# Altium schematic symbol library jlcpcb_2025_04_resistors_extended_1210.schlib: 2670 symbols (part 10 of 14)
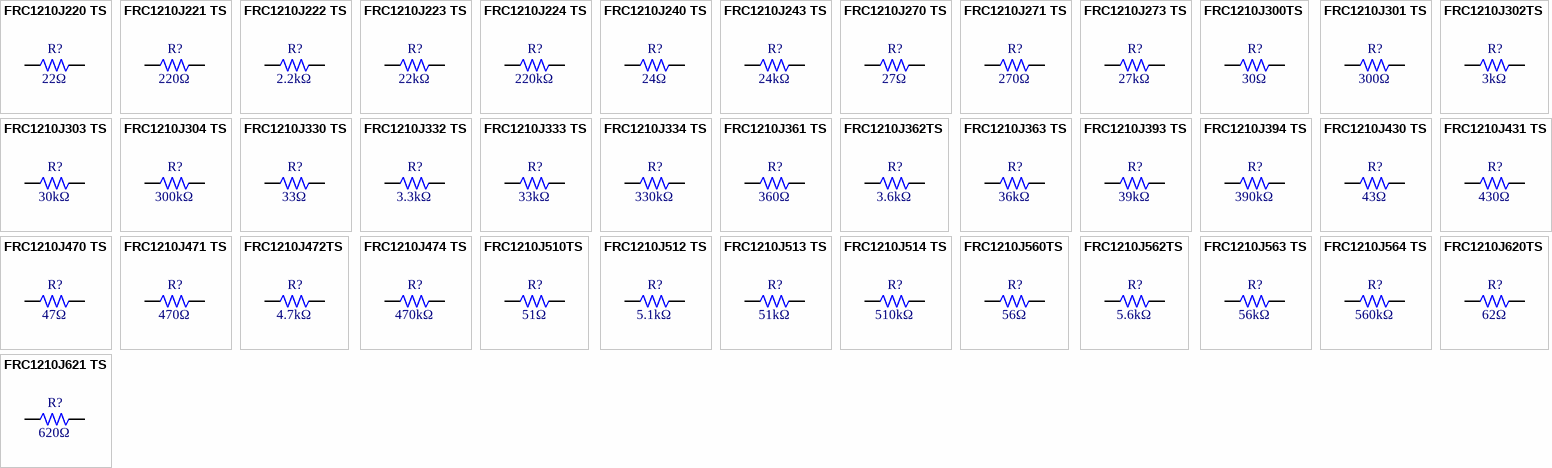
[diagram p75: symbols FRC1210J220 TS to FRC1210J621 TS]

## FRC1210J512 TS
designator R?  Resistance: 5.1kΩ  (hidden comment: *)
Resistor, 5.1kΩ, ±5%, 333.333mW, 200V, ±100ppm/℃, -55℃~+155℃, SMD 1210; Manufacturer: Uniroyal; Manufacturer Part Number: FRC1210J512 TS; Supplier 1: LCSC; Supplier Part Number 1: C2933867; JLCPCB Part Number: C2933867; Power Rating: 333.333mW; Category: Resistors; Package Size: 1210; JLCPCB Basic Part: Yes; Tolerance: ±5%; Voltage Rating: 200V; Temperature Coefficient: ±100ppm/℃; Temperature Rating: -55℃~+155℃; ComponentLink1Description: Datasheet; ComponentLink1URL: https://wmsc.lcsc.com/wmsc/upload/file/pdf/v2/lcsc/2308241115_FOJAN-FRC1210J512-TS_C2933867.pdf; ComponentLink2Description: JLCPCB Part URL; ComponentLink2URL: https://jlcpcb.com/partdetail/C2933867
pins: 1, 2
1 alternate drawing of the same symbol

## FRC1210J513 TS
designator R?  Resistance: 51kΩ  (hidden comment: *)
Resistor, 51kΩ, ±5%, 333.333mW, 200V, ±100ppm/℃, -55℃~+155℃, SMD 1210; Manufacturer: Uniroyal; Manufacturer Part Number: FRC1210J513 TS; Supplier 1: LCSC; Supplier Part Number 1: C2960679; JLCPCB Part Number: C2960679; Power Rating: 333.333mW; Category: Resistors; Package Size: 1210; JLCPCB Basic Part: Yes; Tolerance: ±5%; Voltage Rating: 200V; Temperature Coefficient: ±100ppm/℃; Temperature Rating: -55℃~+155℃; ComponentLink1Description: Datasheet; ComponentLink1URL: https://wmsc.lcsc.com/wmsc/upload/file/pdf/v2/lcsc/2308241947_FOJAN-FRC1210J513-TS_C2960679.pdf; ComponentLink2Description: JLCPCB Part URL; ComponentLink2URL: https://jlcpcb.com/partdetail/C2960679
pins: 1, 2
1 alternate drawing of the same symbol

## FRC1210J514 TS
designator R?  Resistance: 510kΩ  (hidden comment: *)
Resistor, 510kΩ, ±5%, 333.333mW, 200V, ±100ppm/℃, -55℃~+155℃, SMD 1210; Manufacturer: Uniroyal; Manufacturer Part Number: FRC1210J514 TS; Supplier 1: LCSC; Supplier Part Number 1: C2960696; JLCPCB Part Number: C2960696; Power Rating: 333.333mW; Category: Resistors; Package Size: 1210; JLCPCB Basic Part: Yes; Tolerance: ±5%; Voltage Rating: 200V; Temperature Coefficient: ±100ppm/℃; Temperature Rating: -55℃~+155℃; ComponentLink1Description: Datasheet; ComponentLink1URL: https://wmsc.lcsc.com/wmsc/upload/file/pdf/v2/lcsc/2308241947_FOJAN-FRC1210J514-TS_C2960696.pdf; ComponentLink2Description: JLCPCB Part URL; ComponentLink2URL: https://jlcpcb.com/partdetail/C2960696
pins: 1, 2
1 alternate drawing of the same symbol

## FRC1210J560TS
designator R?  Resistance: 56Ω  (hidden comment: *)
Resistor, 56Ω, ±5%, 333.333mW, 200V, ±100ppm/℃, -55℃~+155℃, SMD 1210; Manufacturer: Uniroyal; Manufacturer Part Number: FRC1210J560TS; Supplier 1: LCSC; Supplier Part Number 1: C2930446; JLCPCB Part Number: C2930446; Power Rating: 333.333mW; Category: Resistors; Package Size: 1210; JLCPCB Basic Part: Yes; Tolerance: ±5%; Voltage Rating: 200V; Temperature Coefficient: ±100ppm/℃; Temperature Rating: -55℃~+155℃; ComponentLink1Description: Datasheet; ComponentLink1URL: https://wmsc.lcsc.com/wmsc/upload/file/pdf/v2/lcsc/2308241947_FOJAN-FRC1210J560TS_C2930446.pdf; ComponentLink2Description: JLCPCB Part URL; ComponentLink2URL: https://jlcpcb.com/partdetail/C2930446
pins: 1, 2
1 alternate drawing of the same symbol

## FRC1210J562TS
designator R?  Resistance: 5.6kΩ  (hidden comment: *)
Resistor, 5.6kΩ, ±5%, 333.333mW, 200V, ±100ppm/℃, -55℃~+155℃, SMD 1210; Manufacturer: Uniroyal; Manufacturer Part Number: FRC1210J562TS; Supplier 1: LCSC; Supplier Part Number 1: C2930445; JLCPCB Part Number: C2930445; Power Rating: 333.333mW; Category: Resistors; Package Size: 1210; JLCPCB Basic Part: Yes; Tolerance: ±5%; Voltage Rating: 200V; Temperature Coefficient: ±100ppm/℃; Temperature Rating: -55℃~+155℃; ComponentLink1Description: Datasheet; ComponentLink1URL: https://wmsc.lcsc.com/wmsc/upload/file/pdf/v2/lcsc/2308241947_FOJAN-FRC1210J562TS_C2930445.pdf; ComponentLink2Description: JLCPCB Part URL; ComponentLink2URL: https://jlcpcb.com/partdetail/C2930445
pins: 1, 2
1 alternate drawing of the same symbol

## FRC1210J563 TS
designator R?  Resistance: 56kΩ  (hidden comment: *)
Resistor, 56kΩ, ±5%, 333.333mW, 200V, ±100ppm/℃, -55℃~+155℃, SMD 1210; Manufacturer: Uniroyal; Manufacturer Part Number: FRC1210J563 TS; Supplier 1: LCSC; Supplier Part Number 1: C2960918; JLCPCB Part Number: C2960918; Power Rating: 333.333mW; Category: Resistors; Package Size: 1210; JLCPCB Basic Part: Yes; Tolerance: ±5%; Voltage Rating: 200V; Temperature Coefficient: ±100ppm/℃; Temperature Rating: -55℃~+155℃; ComponentLink1Description: Datasheet; ComponentLink1URL: https://wmsc.lcsc.com/wmsc/upload/file/pdf/v2/lcsc/2308241947_FOJAN-FRC1210J563-TS_C2960918.pdf; ComponentLink2Description: JLCPCB Part URL; ComponentLink2URL: https://jlcpcb.com/partdetail/C2960918
pins: 1, 2
1 alternate drawing of the same symbol

## FRC1210J564 TS
designator R?  Resistance: 560kΩ  (hidden comment: *)
Resistor, 560kΩ, ±5%, 333.333mW, 200V, ±100ppm/℃, -55℃~+155℃, SMD 1210; Manufacturer: Uniroyal; Manufacturer Part Number: FRC1210J564 TS; Supplier 1: LCSC; Supplier Part Number 1: C2933869; JLCPCB Part Number: C2933869; Power Rating: 333.333mW; Category: Resistors; Package Size: 1210; JLCPCB Basic Part: Yes; Tolerance: ±5%; Voltage Rating: 200V; Temperature Coefficient: ±100ppm/℃; Temperature Rating: -55℃~+155℃; ComponentLink1Description: Datasheet; ComponentLink1URL: https://wmsc.lcsc.com/wmsc/upload/file/pdf/v2/lcsc/2308241115_FOJAN-FRC1210J564-TS_C2933869.pdf; ComponentLink2Description: JLCPCB Part URL; ComponentLink2URL: https://jlcpcb.com/partdetail/C2933869
pins: 1, 2
1 alternate drawing of the same symbol

## FRC1210J620TS
designator R?  Resistance: 62Ω  (hidden comment: *)
Resistor, 62Ω, ±5%, 333.333mW, 200V, ±100ppm/℃, SMD 1210; Manufacturer: Uniroyal; Manufacturer Part Number: FRC1210J620TS; Supplier 1: LCSC; Supplier Part Number 1: C3000565; JLCPCB Part Number: C3000565; Power Rating: 333.333mW; Category: Resistors; Package Size: 1210; JLCPCB Basic Part: Yes; Tolerance: ±5%; Voltage Rating: 200V; Temperature Coefficient: ±100ppm/℃; ComponentLink1Description: Datasheet; ComponentLink1URL: https://wmsc.lcsc.com/wmsc/upload/file/pdf/v2/lcsc/2308241947_FOJAN-FRC1210J620TS_C3000565.pdf; ComponentLink2Description: JLCPCB Part URL; ComponentLink2URL: https://jlcpcb.com/partdetail/C3000565
pins: 1, 2
1 alternate drawing of the same symbol

## FRC1210J621 TS
designator R?  Resistance: 620Ω  (hidden comment: *)
Resistor, 620Ω, ±5%, 333.333mW, 200V, ±100ppm/℃, -55℃~+155℃, SMD 1210; Manufacturer: Uniroyal; Manufacturer Part Number: FRC1210J621 TS; Supplier 1: LCSC; Supplier Part Number 1: C2933871; JLCPCB Part Number: C2933871; Power Rating: 333.333mW; Category: Resistors; Package Size: 1210; JLCPCB Basic Part: Yes; Tolerance: ±5%; Voltage Rating: 200V; Temperature Coefficient: ±100ppm/℃; Temperature Rating: -55℃~+155℃; ComponentLink1Description: Datasheet; ComponentLink1URL: https://wmsc.lcsc.com/wmsc/upload/file/pdf/v2/lcsc/2308241115_FOJAN-FRC1210J621-TS_C2933871.pdf; ComponentLink2Description: JLCPCB Part URL; ComponentLink2URL: https://jlcpcb.com/partdetail/C2933871
pins: 1, 2
1 alternate drawing of the same symbol

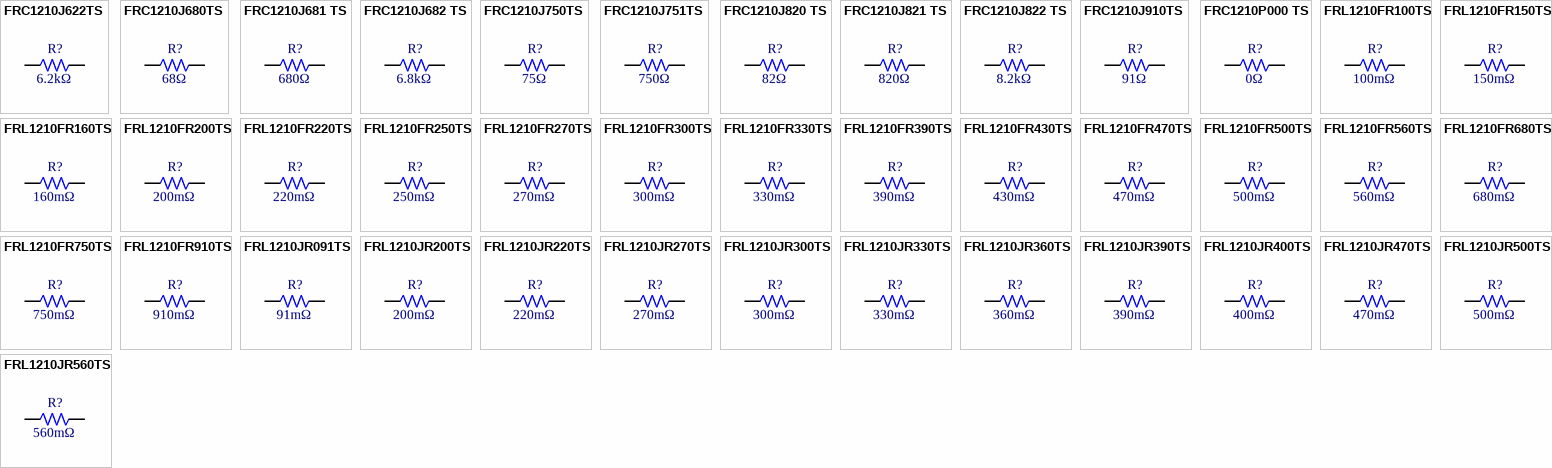
[diagram p44: symbols FRC1210J622TS to FRL1210JR560TS]

## FRC1210J622TS
designator R?  Resistance: 6.2kΩ  (hidden comment: *)
Resistor, 6.2kΩ, ±5%, 333.333mW, 200V, ±100ppm/℃, -55℃~+155℃, SMD 1210; Manufacturer: Uniroyal; Manufacturer Part Number: FRC1210J622TS; Supplier 1: LCSC; Supplier Part Number 1: C2930447; JLCPCB Part Number: C2930447; Power Rating: 333.333mW; Category: Resistors; Package Size: 1210; JLCPCB Basic Part: Yes; Tolerance: ±5%; Voltage Rating: 200V; Temperature Coefficient: ±100ppm/℃; Temperature Rating: -55℃~+155℃; ComponentLink1Description: Datasheet; ComponentLink1URL: https://wmsc.lcsc.com/wmsc/upload/file/pdf/v2/lcsc/2308241947_FOJAN-FRC1210J622TS_C2930447.pdf; ComponentLink2Description: JLCPCB Part URL; ComponentLink2URL: https://jlcpcb.com/partdetail/C2930447
pins: 1, 2
1 alternate drawing of the same symbol

## FRC1210J680TS
designator R?  Resistance: 68Ω  (hidden comment: *)
Resistor, 68Ω, ±5%, 333.333mW, 200V, ±100ppm/℃, -55℃~+155℃, SMD 1210; Manufacturer: Uniroyal; Manufacturer Part Number: FRC1210J680TS; Supplier 1: LCSC; Supplier Part Number 1: C2930448; JLCPCB Part Number: C2930448; Power Rating: 333.333mW; Category: Resistors; Package Size: 1210; JLCPCB Basic Part: Yes; Tolerance: ±5%; Voltage Rating: 200V; Temperature Coefficient: ±100ppm/℃; Temperature Rating: -55℃~+155℃; ComponentLink1Description: Datasheet; ComponentLink1URL: https://wmsc.lcsc.com/wmsc/upload/file/pdf/v2/lcsc/2308241947_FOJAN-FRC1210J680TS_C2930448.pdf; ComponentLink2Description: JLCPCB Part URL; ComponentLink2URL: https://jlcpcb.com/partdetail/C2930448
pins: 1, 2
1 alternate drawing of the same symbol

## FRC1210J681 TS
designator R?  Resistance: 680Ω  (hidden comment: *)
Resistor, 680Ω, ±5%, 333.333mW, 200V, ±100ppm/℃, -55℃~+155℃, SMD 1210; Manufacturer: Uniroyal; Manufacturer Part Number: FRC1210J681 TS; Supplier 1: LCSC; Supplier Part Number 1: C2907553; JLCPCB Part Number: C2907553; Power Rating: 333.333mW; Category: Resistors; Package Size: 1210; JLCPCB Basic Part: Yes; Tolerance: ±5%; Voltage Rating: 200V; Temperature Coefficient: ±100ppm/℃; Temperature Rating: -55℃~+155℃; ComponentLink1Description: Datasheet; ComponentLink1URL: https://wmsc.lcsc.com/wmsc/upload/file/pdf/v2/lcsc/2308241947_FOJAN-FRC1210J681-TS_C2907553.pdf; ComponentLink2Description: JLCPCB Part URL; ComponentLink2URL: https://jlcpcb.com/partdetail/C2907553
pins: 1, 2
1 alternate drawing of the same symbol

## FRC1210J682 TS
designator R?  Resistance: 6.8kΩ  (hidden comment: *)
Resistor, 6.8kΩ, ±5%, 333.333mW, 200V, ±100ppm/℃, -55℃~+155℃, SMD 1210; Manufacturer: Uniroyal; Manufacturer Part Number: FRC1210J682 TS; Supplier 1: LCSC; Supplier Part Number 1: C2933872; JLCPCB Part Number: C2933872; Power Rating: 333.333mW; Category: Resistors; Package Size: 1210; JLCPCB Basic Part: Yes; Tolerance: ±5%; Voltage Rating: 200V; Temperature Coefficient: ±100ppm/℃; Temperature Rating: -55℃~+155℃; ComponentLink1Description: Datasheet; ComponentLink1URL: https://wmsc.lcsc.com/wmsc/upload/file/pdf/v2/lcsc/2308241115_FOJAN-FRC1210J682-TS_C2933872.pdf; ComponentLink2Description: JLCPCB Part URL; ComponentLink2URL: https://jlcpcb.com/partdetail/C2933872
pins: 1, 2
1 alternate drawing of the same symbol

## FRC1210J750TS
designator R?  Resistance: 75Ω  (hidden comment: *)
Resistor, 75Ω, ±5%, 333.333mW, 200V, ±100ppm/℃, SMD 1210; Manufacturer: Uniroyal; Manufacturer Part Number: FRC1210J750TS; Supplier 1: LCSC; Supplier Part Number 1: C3000695; JLCPCB Part Number: C3000695; Power Rating: 333.333mW; Category: Resistors; Package Size: 1210; JLCPCB Basic Part: Yes; Tolerance: ±5%; Voltage Rating: 200V; Temperature Coefficient: ±100ppm/℃; ComponentLink1Description: Datasheet; ComponentLink1URL: https://wmsc.lcsc.com/wmsc/upload/file/pdf/v2/lcsc/2308241947_FOJAN-FRC1210J750TS_C3000695.pdf; ComponentLink2Description: JLCPCB Part URL; ComponentLink2URL: https://jlcpcb.com/partdetail/C3000695
pins: 1, 2
1 alternate drawing of the same symbol

## FRC1210J751TS
designator R?  Resistance: 750Ω  (hidden comment: *)
Resistor, 750Ω, ±5%, 333.333mW, 200V, ±100ppm/℃, SMD 1210; Manufacturer: Uniroyal; Manufacturer Part Number: FRC1210J751TS; Supplier 1: LCSC; Supplier Part Number 1: C3000694; JLCPCB Part Number: C3000694; Power Rating: 333.333mW; Category: Resistors; Package Size: 1210; JLCPCB Basic Part: Yes; Tolerance: ±5%; Voltage Rating: 200V; Temperature Coefficient: ±100ppm/℃; ComponentLink1Description: Datasheet; ComponentLink1URL: https://wmsc.lcsc.com/wmsc/upload/file/pdf/v2/lcsc/2308241947_FOJAN-FRC1210J751TS_C3000694.pdf; ComponentLink2Description: JLCPCB Part URL; ComponentLink2URL: https://jlcpcb.com/partdetail/C3000694
pins: 1, 2
1 alternate drawing of the same symbol

## FRC1210J820 TS
designator R?  Resistance: 82Ω  (hidden comment: *)
Resistor, 82Ω, ±5%, 333.333mW, 200V, ±100ppm/℃, -55℃~+155℃, SMD 1210; Manufacturer: Uniroyal; Manufacturer Part Number: FRC1210J820 TS; Supplier 1: LCSC; Supplier Part Number 1: C2960766; JLCPCB Part Number: C2960766; Power Rating: 333.333mW; Category: Resistors; Package Size: 1210; JLCPCB Basic Part: Yes; Tolerance: ±5%; Voltage Rating: 200V; Temperature Coefficient: ±100ppm/℃; Temperature Rating: -55℃~+155℃; ComponentLink1Description: Datasheet; ComponentLink1URL: https://wmsc.lcsc.com/wmsc/upload/file/pdf/v2/lcsc/2308241947_FOJAN-FRC1210J820-TS_C2960766.pdf; ComponentLink2Description: JLCPCB Part URL; ComponentLink2URL: https://jlcpcb.com/partdetail/C2960766
pins: 1, 2
1 alternate drawing of the same symbol

## FRC1210J821 TS
designator R?  Resistance: 820Ω  (hidden comment: *)
Resistor, 820Ω, ±5%, 333.333mW, 200V, ±100ppm/℃, -55℃~+155℃, SMD 1210; Manufacturer: Uniroyal; Manufacturer Part Number: FRC1210J821 TS; Supplier 1: LCSC; Supplier Part Number 1: C2907554; JLCPCB Part Number: C2907554; Power Rating: 333.333mW; Category: Resistors; Package Size: 1210; JLCPCB Basic Part: Yes; Tolerance: ±5%; Voltage Rating: 200V; Temperature Coefficient: ±100ppm/℃; Temperature Rating: -55℃~+155℃; ComponentLink1Description: Datasheet; ComponentLink1URL: https://wmsc.lcsc.com/wmsc/upload/file/pdf/v2/lcsc/2308241947_FOJAN-FRC1210J821-TS_C2907554.pdf; ComponentLink2Description: JLCPCB Part URL; ComponentLink2URL: https://jlcpcb.com/partdetail/C2907554
pins: 1, 2
1 alternate drawing of the same symbol

## FRC1210J822 TS
designator R?  Resistance: 8.2kΩ  (hidden comment: *)
Resistor, 8.2kΩ, ±5%, 333.333mW, 200V, ±100ppm/℃, -55℃~+155℃, SMD 1210; Manufacturer: Uniroyal; Manufacturer Part Number: FRC1210J822 TS; Supplier 1: LCSC; Supplier Part Number 1: C2960785; JLCPCB Part Number: C2960785; Power Rating: 333.333mW; Category: Resistors; Package Size: 1210; JLCPCB Basic Part: Yes; Tolerance: ±5%; Voltage Rating: 200V; Temperature Coefficient: ±100ppm/℃; Temperature Rating: -55℃~+155℃; ComponentLink1Description: Datasheet; ComponentLink1URL: https://wmsc.lcsc.com/wmsc/upload/file/pdf/v2/lcsc/2308241947_FOJAN-FRC1210J822-TS_C2960785.pdf; ComponentLink2Description: JLCPCB Part URL; ComponentLink2URL: https://jlcpcb.com/partdetail/C2960785
pins: 1, 2
1 alternate drawing of the same symbol

## FRC1210J910TS
designator R?  Resistance: 91Ω  (hidden comment: *)
Resistor, 91Ω, ±5%, 333.333mW, 200V, ±100ppm/℃, SMD 1210; Manufacturer: Uniroyal; Manufacturer Part Number: FRC1210J910TS; Supplier 1: LCSC; Supplier Part Number 1: C3000567; JLCPCB Part Number: C3000567; Power Rating: 333.333mW; Category: Resistors; Package Size: 1210; JLCPCB Basic Part: Yes; Tolerance: ±5%; Voltage Rating: 200V; Temperature Coefficient: ±100ppm/℃; ComponentLink1Description: Datasheet; ComponentLink1URL: https://wmsc.lcsc.com/wmsc/upload/file/pdf/v2/lcsc/2308241947_FOJAN-FRC1210J910TS_C3000567.pdf; ComponentLink2Description: JLCPCB Part URL; ComponentLink2URL: https://jlcpcb.com/partdetail/C3000567
pins: 1, 2
1 alternate drawing of the same symbol

## FRC1210P000 TS
designator R?  Resistance: 0Ω  (hidden comment: *)
Resistor, 0Ω, -55℃~+155℃, SMD 1210; Manufacturer: Uniroyal; Manufacturer Part Number: FRC1210P000 TS; Supplier 1: LCSC; Supplier Part Number 1: C2907543; JLCPCB Part Number: C2907543; Category: Resistors; Package Size: 1210; JLCPCB Basic Part: Yes; Temperature Rating: -55℃~+155℃; ComponentLink1Description: Datasheet; ComponentLink1URL: https://wmsc.lcsc.com/wmsc/upload/file/pdf/v2/lcsc/2308241947_FOJAN-FRC1210P000-TS_C2907543.pdf; ComponentLink2Description: JLCPCB Part URL; ComponentLink2URL: https://jlcpcb.com/partdetail/C2907543
pins: 1, 2
1 alternate drawing of the same symbol

## FRL1210FR100TS
designator R?  Resistance: 100mΩ  (hidden comment: *)
Resistor, 100mΩ, ±1%, 333.333mW, 500V, ±1200ppm/℃, -55℃~+155℃, SMD 1210; Manufacturer: Uniroyal; Manufacturer Part Number: FRL1210FR100TS; Supplier 1: LCSC; Supplier Part Number 1: C2974119; JLCPCB Part Number: C2974119; Power Rating: 333.333mW; Category: Resistors; Package Size: 1210; JLCPCB Basic Part: Yes; Tolerance: ±1%; Voltage Rating: 500V; Temperature Coefficient: ±1200ppm/℃; Temperature Rating: -55℃~+155℃; ComponentLink1Description: Datasheet; ComponentLink1URL: https://wmsc.lcsc.com/wmsc/upload/file/pdf/v2/lcsc/2202151130_FOJAN-FRL1210FR100TS_C2974119.pdf; ComponentLink2Description: JLCPCB Part URL; ComponentLink2URL: https://jlcpcb.com/partdetail/C2974119
pins: 1, 2
1 alternate drawing of the same symbol

## FRL1210FR150TS
designator R?  Resistance: 150mΩ  (hidden comment: *)
Resistor, 150mΩ, ±1%, 333.333mW, 500V, ±1200ppm/℃, -55℃~+155℃, SMD 1210; Manufacturer: Uniroyal; Manufacturer Part Number: FRL1210FR150TS; Supplier 1: LCSC; Supplier Part Number 1: C2934310; JLCPCB Part Number: C2934310; Power Rating: 333.333mW; Category: Resistors; Package Size: 1210; JLCPCB Basic Part: Yes; Tolerance: ±1%; Voltage Rating: 500V; Temperature Coefficient: ±1200ppm/℃; Temperature Rating: -55℃~+155℃; ComponentLink1Description: Datasheet; ComponentLink1URL: https://wmsc.lcsc.com/wmsc/upload/file/pdf/v2/lcsc/2308241947_FOJAN-FRL1210FR150TS_C2934310.pdf; ComponentLink2Description: JLCPCB Part URL; ComponentLink2URL: https://jlcpcb.com/partdetail/C2934310
pins: 1, 2
1 alternate drawing of the same symbol

## FRL1210FR160TS
designator R?  Resistance: 160mΩ  (hidden comment: *)
Resistor, 160mΩ, ±1%, 500mW, 200V, ±200ppm/℃, -55℃~+155℃, SMD 1210; Manufacturer: Uniroyal; Manufacturer Part Number: FRL1210FR160TS; Supplier 1: LCSC; Supplier Part Number 1: C2934311; JLCPCB Part Number: C2934311; Power Rating: 500mW; Category: Resistors; Package Size: 1210; JLCPCB Basic Part: Yes; Tolerance: ±1%; Voltage Rating: 200V; Temperature Coefficient: ±200ppm/℃; Temperature Rating: -55℃~+155℃; ComponentLink1Description: Datasheet; ComponentLink1URL: https://wmsc.lcsc.com/wmsc/upload/file/pdf/v2/lcsc/2308241947_FOJAN-FRL1210FR160TS_C2934311.pdf; ComponentLink2Description: JLCPCB Part URL; ComponentLink2URL: https://jlcpcb.com/partdetail/C2934311
pins: 1, 2
1 alternate drawing of the same symbol

## FRL1210FR200TS
designator R?  Resistance: 200mΩ  (hidden comment: *)
Resistor, 200mΩ, ±1%, 333.333mW, 500V, ±600ppm/℃, -55℃~+155℃, SMD 1210; Manufacturer: Uniroyal; Manufacturer Part Number: FRL1210FR200TS; Supplier 1: LCSC; Supplier Part Number 1: C2934312; JLCPCB Part Number: C2934312; Power Rating: 333.333mW; Category: Resistors; Package Size: 1210; JLCPCB Basic Part: Yes; Tolerance: ±1%; Voltage Rating: 500V; Temperature Coefficient: ±600ppm/℃; Temperature Rating: -55℃~+155℃; ComponentLink1Description: Datasheet; ComponentLink1URL: https://wmsc.lcsc.com/wmsc/upload/file/pdf/v2/lcsc/2308241947_FOJAN-FRL1210FR200TS_C2934312.pdf; ComponentLink2Description: JLCPCB Part URL; ComponentLink2URL: https://jlcpcb.com/partdetail/C2934312
pins: 1, 2
1 alternate drawing of the same symbol

## FRL1210FR220TS
designator R?  Resistance: 220mΩ  (hidden comment: *)
Resistor, 220mΩ, ±1%, 333.333mW, 500V, ±300ppm/℃, -55℃~+155℃, SMD 1210; Manufacturer: Uniroyal; Manufacturer Part Number: FRL1210FR220TS; Supplier 1: LCSC; Supplier Part Number 1: C2934313; JLCPCB Part Number: C2934313; Power Rating: 333.333mW; Category: Resistors; Package Size: 1210; JLCPCB Basic Part: Yes; Tolerance: ±1%; Voltage Rating: 500V; Temperature Coefficient: ±300ppm/℃; Temperature Rating: -55℃~+155℃; ComponentLink1Description: Datasheet; ComponentLink1URL: https://wmsc.lcsc.com/wmsc/upload/file/pdf/v2/lcsc/2308241947_FOJAN-FRL1210FR220TS_C2934313.pdf; ComponentLink2Description: JLCPCB Part URL; ComponentLink2URL: https://jlcpcb.com/partdetail/C2934313
pins: 1, 2
1 alternate drawing of the same symbol

## FRL1210FR250TS
designator R?  Resistance: 250mΩ  (hidden comment: *)
Resistor, 250mΩ, ±1%, 333.333mW, 500V, ±300ppm/℃, -55℃~+155℃, SMD 1210; Manufacturer: Uniroyal; Manufacturer Part Number: FRL1210FR250TS; Supplier 1: LCSC; Supplier Part Number 1: C2934314; JLCPCB Part Number: C2934314; Power Rating: 333.333mW; Category: Resistors; Package Size: 1210; JLCPCB Basic Part: Yes; Tolerance: ±1%; Voltage Rating: 500V; Temperature Coefficient: ±300ppm/℃; Temperature Rating: -55℃~+155℃; ComponentLink1Description: Datasheet; ComponentLink1URL: https://wmsc.lcsc.com/wmsc/upload/file/pdf/v2/lcsc/2308241947_FOJAN-FRL1210FR250TS_C2934314.pdf; ComponentLink2Description: JLCPCB Part URL; ComponentLink2URL: https://jlcpcb.com/partdetail/C2934314
pins: 1, 2
1 alternate drawing of the same symbol

## FRL1210FR270TS
designator R?  Resistance: 270mΩ  (hidden comment: *)
Resistor, 270mΩ, ±1%, 333.333mW, 500V, ±300ppm/℃, -55℃~+155℃, SMD 1210; Manufacturer: Uniroyal; Manufacturer Part Number: FRL1210FR270TS; Supplier 1: LCSC; Supplier Part Number 1: C2974120; JLCPCB Part Number: C2974120; Power Rating: 333.333mW; Category: Resistors; Package Size: 1210; JLCPCB Basic Part: Yes; Tolerance: ±1%; Voltage Rating: 500V; Temperature Coefficient: ±300ppm/℃; Temperature Rating: -55℃~+155℃; ComponentLink1Description: Datasheet; ComponentLink1URL: https://wmsc.lcsc.com/wmsc/upload/file/pdf/v2/lcsc/2202151130_FOJAN-FRL1210FR270TS_C2974120.pdf; ComponentLink2Description: JLCPCB Part URL; ComponentLink2URL: https://jlcpcb.com/partdetail/C2974120
pins: 1, 2
1 alternate drawing of the same symbol

## FRL1210FR300TS
designator R?  Resistance: 300mΩ  (hidden comment: *)
Resistor, 300mΩ, ±1%, 333.333mW, 500V, ±300ppm/℃, -55℃~+155℃, SMD 1210; Manufacturer: Uniroyal; Manufacturer Part Number: FRL1210FR300TS; Supplier 1: LCSC; Supplier Part Number 1: C2974121; JLCPCB Part Number: C2974121; Power Rating: 333.333mW; Category: Resistors; Package Size: 1210; JLCPCB Basic Part: Yes; Tolerance: ±1%; Voltage Rating: 500V; Temperature Coefficient: ±300ppm/℃; Temperature Rating: -55℃~+155℃; ComponentLink1Description: Datasheet; ComponentLink1URL: https://wmsc.lcsc.com/wmsc/upload/file/pdf/v2/lcsc/2202151130_FOJAN-FRL1210FR300TS_C2974121.pdf; ComponentLink2Description: JLCPCB Part URL; ComponentLink2URL: https://jlcpcb.com/partdetail/C2974121
pins: 1, 2
1 alternate drawing of the same symbol

## FRL1210FR330TS
designator R?  Resistance: 330mΩ  (hidden comment: *)
Resistor, 330mΩ, ±1%, 333.333mW, 500V, ±300ppm/℃, -55℃~+155℃, SMD 1210; Manufacturer: Uniroyal; Manufacturer Part Number: FRL1210FR330TS; Supplier 1: LCSC; Supplier Part Number 1: C2960935; JLCPCB Part Number: C2960935; Power Rating: 333.333mW; Category: Resistors; Package Size: 1210; JLCPCB Basic Part: Yes; Tolerance: ±1%; Voltage Rating: 500V; Temperature Coefficient: ±300ppm/℃; Temperature Rating: -55℃~+155℃; ComponentLink1Description: Datasheet; ComponentLink1URL: https://wmsc.lcsc.com/wmsc/upload/file/pdf/v2/lcsc/2201181800_FOJAN-FRL1210FR330TS_C2960935.pdf; ComponentLink2Description: JLCPCB Part URL; ComponentLink2URL: https://jlcpcb.com/partdetail/C2960935
pins: 1, 2
1 alternate drawing of the same symbol

## FRL1210FR390TS
designator R?  Resistance: 390mΩ  (hidden comment: *)
Resistor, 390mΩ, ±1%, 333.333mW, 500V, ±300ppm/℃, -55℃~+155℃, SMD 1210; Manufacturer: Uniroyal; Manufacturer Part Number: FRL1210FR390TS; Supplier 1: LCSC; Supplier Part Number 1: C2934316; JLCPCB Part Number: C2934316; Power Rating: 333.333mW; Category: Resistors; Package Size: 1210; JLCPCB Basic Part: Yes; Tolerance: ±1%; Voltage Rating: 500V; Temperature Coefficient: ±300ppm/℃; Temperature Rating: -55℃~+155℃; ComponentLink1Description: Datasheet; ComponentLink1URL: https://wmsc.lcsc.com/wmsc/upload/file/pdf/v2/lcsc/2308241947_FOJAN-FRL1210FR390TS_C2934316.pdf; ComponentLink2Description: JLCPCB Part URL; ComponentLink2URL: https://jlcpcb.com/partdetail/C2934316
pins: 1, 2
1 alternate drawing of the same symbol

## FRL1210FR430TS
designator R?  Resistance: 430mΩ  (hidden comment: *)
Resistor, 430mΩ, ±1%, 333.333mW, 500V, ±300ppm/℃, -55℃~+155℃, SMD 1210; Manufacturer: Uniroyal; Manufacturer Part Number: FRL1210FR430TS; Supplier 1: LCSC; Supplier Part Number 1: C2934317; JLCPCB Part Number: C2934317; Power Rating: 333.333mW; Category: Resistors; Package Size: 1210; JLCPCB Basic Part: Yes; Tolerance: ±1%; Voltage Rating: 500V; Temperature Coefficient: ±300ppm/℃; Temperature Rating: -55℃~+155℃; ComponentLink1Description: Datasheet; ComponentLink1URL: https://wmsc.lcsc.com/wmsc/upload/file/pdf/v2/lcsc/2308241947_FOJAN-FRL1210FR430TS_C2934317.pdf; ComponentLink2Description: JLCPCB Part URL; ComponentLink2URL: https://jlcpcb.com/partdetail/C2934317
pins: 1, 2
1 alternate drawing of the same symbol

## FRL1210FR470TS
designator R?  Resistance: 470mΩ  (hidden comment: *)
Resistor, 470mΩ, ±1%, 333.333mW, 500V, ±300ppm/℃, -55℃~+155℃, SMD 1210; Manufacturer: Uniroyal; Manufacturer Part Number: FRL1210FR470TS; Supplier 1: LCSC; Supplier Part Number 1: C2934318; JLCPCB Part Number: C2934318; Power Rating: 333.333mW; Category: Resistors; Package Size: 1210; JLCPCB Basic Part: Yes; Tolerance: ±1%; Voltage Rating: 500V; Temperature Coefficient: ±300ppm/℃; Temperature Rating: -55℃~+155℃; ComponentLink1Description: Datasheet; ComponentLink1URL: https://wmsc.lcsc.com/wmsc/upload/file/pdf/v2/lcsc/2308241947_FOJAN-FRL1210FR470TS_C2934318.pdf; ComponentLink2Description: JLCPCB Part URL; ComponentLink2URL: https://jlcpcb.com/partdetail/C2934318
pins: 1, 2
1 alternate drawing of the same symbol

## FRL1210FR500TS
designator R?  Resistance: 500mΩ  (hidden comment: *)
Resistor, 500mΩ, ±1%, 333.333mW, 500V, ±200ppm/℃, -55℃~+155℃, SMD 1210; Manufacturer: Uniroyal; Manufacturer Part Number: FRL1210FR500TS; Supplier 1: LCSC; Supplier Part Number 1: C2960668; JLCPCB Part Number: C2960668; Power Rating: 333.333mW; Category: Resistors; Package Size: 1210; JLCPCB Basic Part: Yes; Tolerance: ±1%; Voltage Rating: 500V; Temperature Coefficient: ±200ppm/℃; Temperature Rating: -55℃~+155℃; ComponentLink1Description: Datasheet; ComponentLink1URL: https://wmsc.lcsc.com/wmsc/upload/file/pdf/v2/lcsc/2201181800_FOJAN-FRL1210FR500TS_C2960668.pdf; ComponentLink2Description: JLCPCB Part URL; ComponentLink2URL: https://jlcpcb.com/partdetail/C2960668
pins: 1, 2
1 alternate drawing of the same symbol

## FRL1210FR560TS
designator R?  Resistance: 560mΩ  (hidden comment: *)
Resistor, 560mΩ, ±1%, 333.333mW, 500V, ±200ppm/℃, -55℃~+155℃, SMD 1210; Manufacturer: Uniroyal; Manufacturer Part Number: FRL1210FR560TS; Supplier 1: LCSC; Supplier Part Number 1: C2934320; JLCPCB Part Number: C2934320; Power Rating: 333.333mW; Category: Resistors; Package Size: 1210; JLCPCB Basic Part: Yes; Tolerance: ±1%; Voltage Rating: 500V; Temperature Coefficient: ±200ppm/℃; Temperature Rating: -55℃~+155℃; ComponentLink1Description: Datasheet; ComponentLink1URL: https://wmsc.lcsc.com/wmsc/upload/file/pdf/v2/lcsc/2308241947_FOJAN-FRL1210FR560TS_C2934320.pdf; ComponentLink2Description: JLCPCB Part URL; ComponentLink2URL: https://jlcpcb.com/partdetail/C2934320
pins: 1, 2
1 alternate drawing of the same symbol

## FRL1210FR680TS
designator R?  Resistance: 680mΩ  (hidden comment: *)
Resistor, 680mΩ, ±1%, 333.333mW, 500V, ±200ppm/℃, -55℃~+155℃, SMD 1210; Manufacturer: Uniroyal; Manufacturer Part Number: FRL1210FR680TS; Supplier 1: LCSC; Supplier Part Number 1: C2960669; JLCPCB Part Number: C2960669; Power Rating: 333.333mW; Category: Resistors; Package Size: 1210; JLCPCB Basic Part: Yes; Tolerance: ±1%; Voltage Rating: 500V; Temperature Coefficient: ±200ppm/℃; Temperature Rating: -55℃~+155℃; ComponentLink1Description: Datasheet; ComponentLink1URL: https://wmsc.lcsc.com/wmsc/upload/file/pdf/v2/lcsc/2201181800_FOJAN-FRL1210FR680TS_C2960669.pdf; ComponentLink2Description: JLCPCB Part URL; ComponentLink2URL: https://jlcpcb.com/partdetail/C2960669
pins: 1, 2
1 alternate drawing of the same symbol

## FRL1210FR750TS
designator R?  Resistance: 750mΩ  (hidden comment: *)
Resistor, 750mΩ, ±1%, 333.333mW, 500V, ±200ppm/℃, -55℃~+155℃, SMD 1210; Manufacturer: Uniroyal; Manufacturer Part Number: FRL1210FR750TS; Supplier 1: LCSC; Supplier Part Number 1: C2934322; JLCPCB Part Number: C2934322; Power Rating: 333.333mW; Category: Resistors; Package Size: 1210; JLCPCB Basic Part: Yes; Tolerance: ±1%; Voltage Rating: 500V; Temperature Coefficient: ±200ppm/℃; Temperature Rating: -55℃~+155℃; ComponentLink1Description: Datasheet; ComponentLink1URL: https://wmsc.lcsc.com/wmsc/upload/file/pdf/v2/lcsc/2308241947_FOJAN-FRL1210FR750TS_C2934322.pdf; ComponentLink2Description: JLCPCB Part URL; ComponentLink2URL: https://jlcpcb.com/partdetail/C2934322
pins: 1, 2
1 alternate drawing of the same symbol

## FRL1210FR910TS
designator R?  Resistance: 910mΩ  (hidden comment: *)
Resistor, 910mΩ, ±1%, 333.333mW, 500V, ±200ppm/℃, -55℃~+155℃, SMD 1210; Manufacturer: Uniroyal; Manufacturer Part Number: FRL1210FR910TS; Supplier 1: LCSC; Supplier Part Number 1: C2960727; JLCPCB Part Number: C2960727; Power Rating: 333.333mW; Category: Resistors; Package Size: 1210; JLCPCB Basic Part: Yes; Tolerance: ±1%; Voltage Rating: 500V; Temperature Coefficient: ±200ppm/℃; Temperature Rating: -55℃~+155℃; ComponentLink1Description: Datasheet; ComponentLink1URL: https://wmsc.lcsc.com/wmsc/upload/file/pdf/v2/lcsc/2201181800_FOJAN-FRL1210FR910TS_C2960727.pdf; ComponentLink2Description: JLCPCB Part URL; ComponentLink2URL: https://jlcpcb.com/partdetail/C2960727
pins: 1, 2
1 alternate drawing of the same symbol

## FRL1210JR091TS
designator R?  Resistance: 91mΩ  (hidden comment: *)
Resistor, 91mΩ, ±5%, 500mW, 500V, ±600ppm/℃, -55℃~+155℃, SMD 1210; Manufacturer: Uniroyal; Manufacturer Part Number: FRL1210JR091TS; Supplier 1: LCSC; Supplier Part Number 1: C3013359; JLCPCB Part Number: C3013359; Power Rating: 500mW; Category: Resistors; Package Size: 1210; JLCPCB Basic Part: Yes; Tolerance: ±5%; Voltage Rating: 500V; Temperature Coefficient: ±600ppm/℃; Temperature Rating: -55℃~+155℃; ComponentLink1Description: Datasheet; ComponentLink1URL: https://wmsc.lcsc.com/wmsc/upload/file/pdf/v2/lcsc/2308241947_FOJAN-FRL1210JR091TS_C3013359.pdf; ComponentLink2Description: JLCPCB Part URL; ComponentLink2URL: https://jlcpcb.com/partdetail/C3013359
pins: 1, 2
1 alternate drawing of the same symbol

## FRL1210JR200TS
designator R?  Resistance: 200mΩ  (hidden comment: *)
Resistor, 200mΩ, ±5%, 333.333mW, 500V, ±600ppm/℃, SMD 1210; Manufacturer: Uniroyal; Manufacturer Part Number: FRL1210JR200TS; Supplier 1: LCSC; Supplier Part Number 1: C3013360; JLCPCB Part Number: C3013360; Power Rating: 333.333mW; Category: Resistors; Package Size: 1210; JLCPCB Basic Part: Yes; Tolerance: ±5%; Voltage Rating: 500V; Temperature Coefficient: ±600ppm/℃; ComponentLink1Description: Datasheet; ComponentLink1URL: https://wmsc.lcsc.com/wmsc/upload/file/pdf/v2/lcsc/2308241947_FOJAN-FRL1210JR200TS_C3013360.pdf; ComponentLink2Description: JLCPCB Part URL; ComponentLink2URL: https://jlcpcb.com/partdetail/C3013360
pins: 1, 2
1 alternate drawing of the same symbol

## FRL1210JR220TS
designator R?  Resistance: 220mΩ  (hidden comment: *)
Resistor, 220mΩ, ±5%, 333.333mW, 500V, ±300ppm/℃, -55℃~+155℃, SMD 1210; Manufacturer: Uniroyal; Manufacturer Part Number: FRL1210JR220TS; Supplier 1: LCSC; Supplier Part Number 1: C2930450; JLCPCB Part Number: C2930450; Power Rating: 333.333mW; Category: Resistors; Package Size: 1210; JLCPCB Basic Part: Yes; Tolerance: ±5%; Voltage Rating: 500V; Temperature Coefficient: ±300ppm/℃; Temperature Rating: -55℃~+155℃; ComponentLink1Description: Datasheet; ComponentLink1URL: https://wmsc.lcsc.com/wmsc/upload/file/pdf/v2/lcsc/2308241947_FOJAN-FRL1210JR220TS_C2930450.pdf; ComponentLink2Description: JLCPCB Part URL; ComponentLink2URL: https://jlcpcb.com/partdetail/C2930450
pins: 1, 2
1 alternate drawing of the same symbol

## FRL1210JR270TS
designator R?  Resistance: 270mΩ  (hidden comment: *)
Resistor, 270mΩ, ±5%, 333.333mW, 500V, ±300ppm/℃, -55℃~+155℃, SMD 1210; Manufacturer: Uniroyal; Manufacturer Part Number: FRL1210JR270TS; Supplier 1: LCSC; Supplier Part Number 1: C2934328; JLCPCB Part Number: C2934328; Power Rating: 333.333mW; Category: Resistors; Package Size: 1210; JLCPCB Basic Part: Yes; Tolerance: ±5%; Voltage Rating: 500V; Temperature Coefficient: ±300ppm/℃; Temperature Rating: -55℃~+155℃; ComponentLink1Description: Datasheet; ComponentLink1URL: https://wmsc.lcsc.com/wmsc/upload/file/pdf/v2/lcsc/2308241947_FOJAN-FRL1210JR270TS_C2934328.pdf; ComponentLink2Description: JLCPCB Part URL; ComponentLink2URL: https://jlcpcb.com/partdetail/C2934328
pins: 1, 2
1 alternate drawing of the same symbol

## FRL1210JR300TS
designator R?  Resistance: 300mΩ  (hidden comment: *)
Resistor, 300mΩ, ±5%, 333.333mW, 500V, ±300ppm/℃, -55℃~+155℃, SMD 1210; Manufacturer: Uniroyal; Manufacturer Part Number: FRL1210JR300TS; Supplier 1: LCSC; Supplier Part Number 1: C2934329; JLCPCB Part Number: C2934329; Power Rating: 333.333mW; Category: Resistors; Package Size: 1210; JLCPCB Basic Part: Yes; Tolerance: ±5%; Voltage Rating: 500V; Temperature Coefficient: ±300ppm/℃; Temperature Rating: -55℃~+155℃; ComponentLink1Description: Datasheet; ComponentLink1URL: https://wmsc.lcsc.com/wmsc/upload/file/pdf/v2/lcsc/2201181800_FOJAN-FRL1210JR300TS_C2934329.pdf; ComponentLink2Description: JLCPCB Part URL; ComponentLink2URL: https://jlcpcb.com/partdetail/C2934329
pins: 1, 2
1 alternate drawing of the same symbol

## FRL1210JR330TS
designator R?  Resistance: 330mΩ  (hidden comment: *)
Resistor, 330mΩ, ±5%, 333.333mW, 500V, ±300ppm/℃, -55℃~+155℃, SMD 1210; Manufacturer: Uniroyal; Manufacturer Part Number: FRL1210JR330TS; Supplier 1: LCSC; Supplier Part Number 1: C2934330; JLCPCB Part Number: C2934330; Power Rating: 333.333mW; Category: Resistors; Package Size: 1210; JLCPCB Basic Part: Yes; Tolerance: ±5%; Voltage Rating: 500V; Temperature Coefficient: ±300ppm/℃; Temperature Rating: -55℃~+155℃; ComponentLink1Description: Datasheet; ComponentLink1URL: https://wmsc.lcsc.com/wmsc/upload/file/pdf/v2/lcsc/2308241947_FOJAN-FRL1210JR330TS_C2934330.pdf; ComponentLink2Description: JLCPCB Part URL; ComponentLink2URL: https://jlcpcb.com/partdetail/C2934330
pins: 1, 2
1 alternate drawing of the same symbol

## FRL1210JR360TS
designator R?  Resistance: 360mΩ  (hidden comment: *)
Resistor, 360mΩ, ±5%, 333.333mW, 500V, ±300ppm/℃, -55℃~+155℃, SMD 1210; Manufacturer: Uniroyal; Manufacturer Part Number: FRL1210JR360TS; Supplier 1: LCSC; Supplier Part Number 1: C2934331; JLCPCB Part Number: C2934331; Power Rating: 333.333mW; Category: Resistors; Package Size: 1210; JLCPCB Basic Part: Yes; Tolerance: ±5%; Voltage Rating: 500V; Temperature Coefficient: ±300ppm/℃; Temperature Rating: -55℃~+155℃; ComponentLink1Description: Datasheet; ComponentLink1URL: https://wmsc.lcsc.com/wmsc/upload/file/pdf/v2/lcsc/2308241947_FOJAN-FRL1210JR360TS_C2934331.pdf; ComponentLink2Description: JLCPCB Part URL; ComponentLink2URL: https://jlcpcb.com/partdetail/C2934331
pins: 1, 2
1 alternate drawing of the same symbol
